# Altium footprint library Cty1.PcbLib: 1378 footprints (part 60 of 87)
Each footprint in its own frame and in the unit in brackets; x right, y up, seen from the top. Pads: shape width x height; smd on the part's side, far side on the other; paste and mask are expansions set on the pad; w line width, h text height; cw(c..) or ccw(c..) is an arc to the next point about the centre after c.
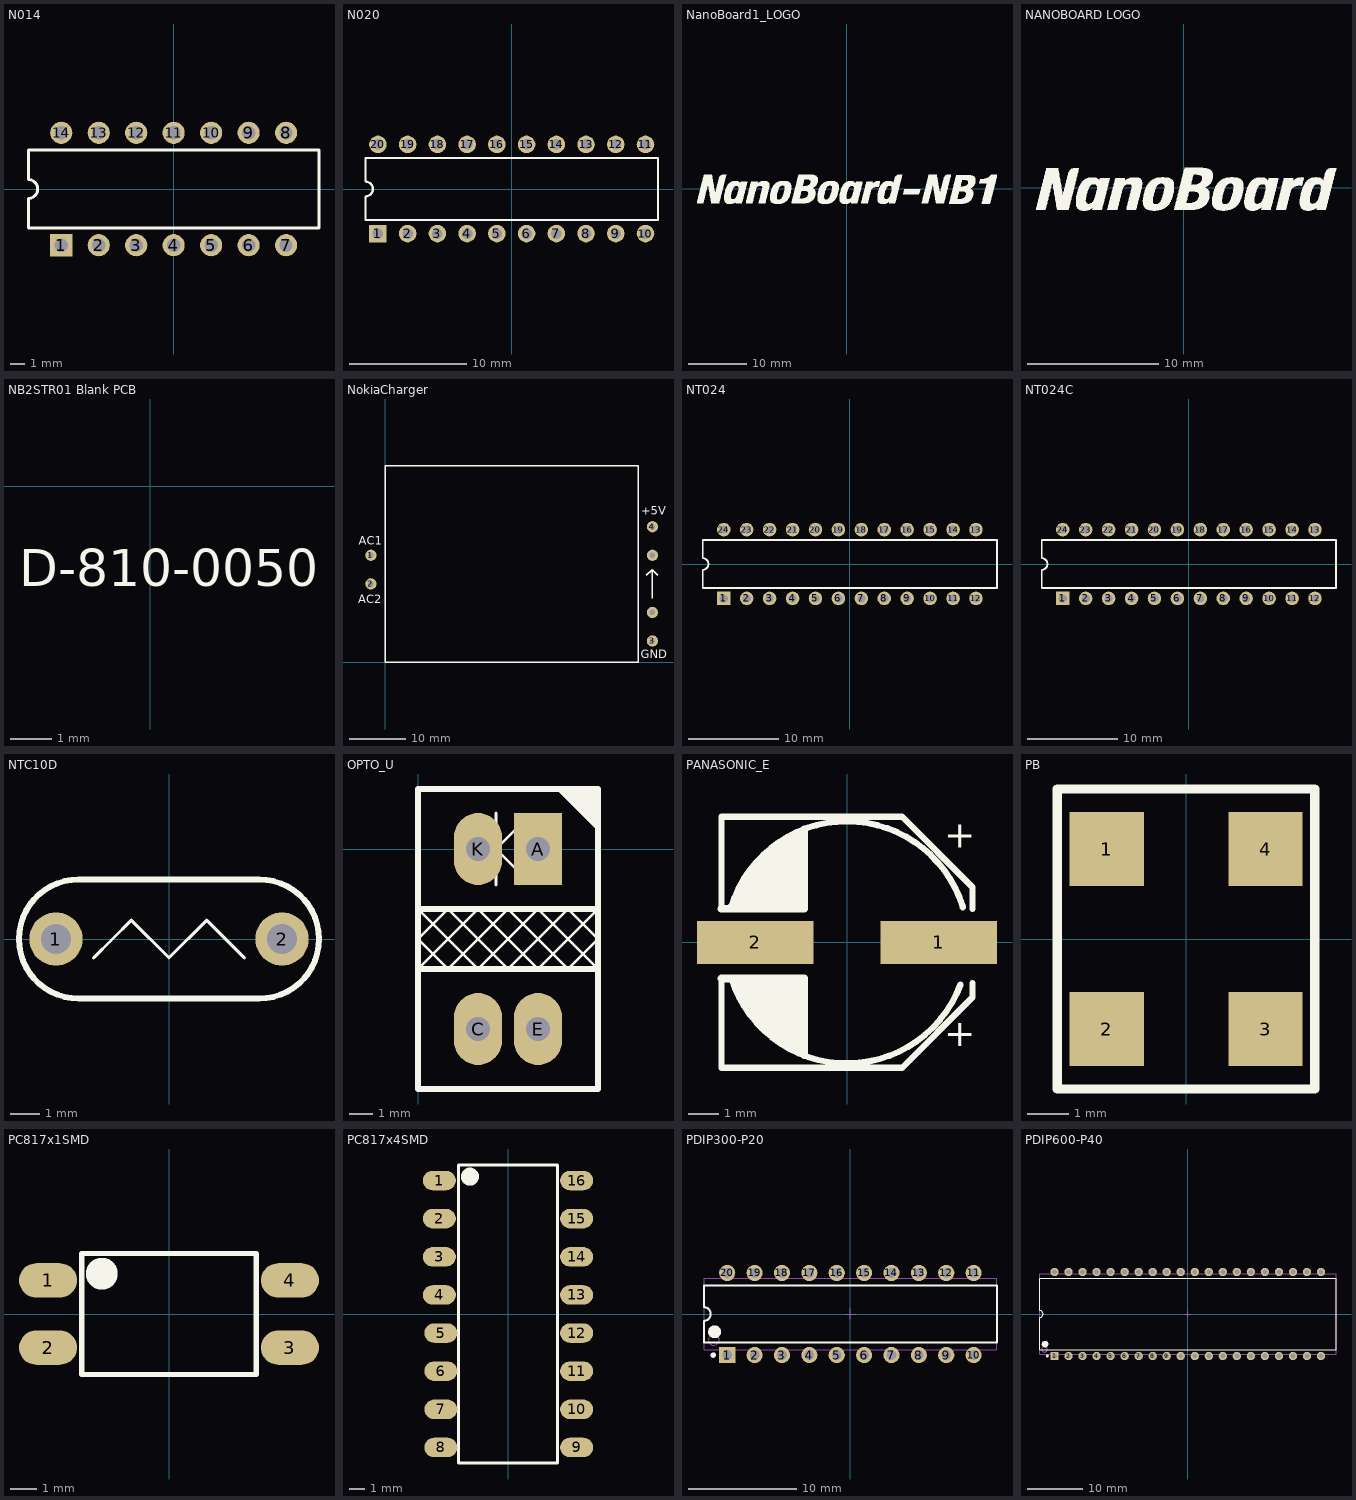
[diagram p59: the footprints below, top view; thin cyan lines are the x and y axes]

## N014 [mm] "DIP; 14 Leads; Row Spacing 7.62 mm; Pitch 2.54 mm"
height 5.08
pads (14):
  rect 1.5x1.5 hole 0.9: 1(-7.62,-3.81)
  round 1.5 hole 0.9: 2(-5.08,-3.81) 3(-2.54,-3.81) 4(0,-3.81) 5(2.54,-3.81) 6(5.08,-3.81) 7(7.62,-3.81) 8(7.62,3.81) 9(5.08,3.81) 10(2.54,3.81) 11(0,3.81) 12(-2.54,3.81) 13(-5.08,3.81) 14(-7.62,3.81)
Top Overlay:
  lines w0.2: -9.85,-2.65 9.85,-2.65 9.85,2.65 -9.85,2.65 -9.85,0.635 cw(c-9.85,0) -9.85,-0.635 -9.85,-2.65

## N020 [mm] "DIP; 20 Leads; Row Spacing 7.62 mm; Pitch 2.54 mm"
height 5.08
pads (20):
  rect 1.5x1.5 hole 0.9: 1(-11.43,-3.81)
  round 1.5 hole 0.9: 2(-8.89,-3.81) 3(-6.35,-3.81) 4(-3.81,-3.81) 5(-1.27,-3.81) 6(1.27,-3.81) 7(3.81,-3.81) 8(6.35,-3.81) 9(8.89,-3.81) 10(11.43,-3.81) 11(11.43,3.81) 12(8.89,3.81) 13(6.35,3.81) 14(3.81,3.81) 15(1.27,3.81) 16(-1.27,3.81) 17(-3.81,3.81) 18(-6.35,3.81) 19(-8.89,3.81) 20(-11.43,3.81)
Top Overlay:
  lines w0.2: -12.5,-2.65 12.5,-2.65 12.5,2.65 -12.5,2.65 -12.5,0.635 cw(c-12.5,0) -12.5,-0.635 -12.5,-2.65

## NanoBoard1_LOGO [mm] "NanoBoard 1 Logo"
height 12.3
Top Overlay:
  drawing of 3535 lines, arcs and shapes, not listed

## NANOBOARD LOGO [mm]
Top Overlay:
  drawing of 1643 lines, arcs and shapes, not listed

## NB2STR01 Blank PCB [mm]
Top Overlay:
  text "D-810-0050" at -3.175,-2.413 h0.89

## NokiaCharger [mm]
pads (6):
  round 2 hole 1: 1(-2.54,19.05) 2(-2.54,13.97) 3(47.54,3.81) 4(47.54,24.13) TEMP(47.54,8.89) TEMP(47.54,19.05)
Top Overlay:
  lines w0.254: 46.482,15.494 47.498,16.51 ; 47.498,11.43 47.498,16.51 ; 48.514,15.494 47.498,16.51 ; 0,0 45,0 ; 0,0 45,0 ; 0,0 0,35 ; 0,35 45,35 ; 0,35 45,35 ; 45,0 45,35
  text "AC2" at -4.826,10.541 h1.52
  text "AC1" at -4.699,20.955 h1.52
  text "+5V" at 45.593,26.289 h1.52
  text "GND" at 45.466,0.762 h1.52

## NT024 [mm] "DIP; 24 Leads; Row Spacing 7.62 mm; Pitch 2.54 mm"
height 5.08
pads (24):
  rect 1.5x1.5 hole 0.9: 1(-13.97,-3.81)
  round 1.5 hole 0.9: 2(-11.43,-3.81) 3(-8.89,-3.81) 4(-6.35,-3.81) 5(-3.81,-3.81) 6(-1.27,-3.81) 7(1.27,-3.81) 8(3.81,-3.81) 9(6.35,-3.81) 10(8.89,-3.81) 11(11.43,-3.81) 12(13.97,-3.81) 13(13.97,3.81) 14(11.43,3.81) 15(8.89,3.81) 16(6.35,3.81) 17(3.81,3.81) 18(1.27,3.81) 19(-1.27,3.81) 20(-3.81,3.81) 21(-6.35,3.81) 22(-8.89,3.81) 23(-11.43,3.81) 24(-13.97,3.81)
Top Overlay:
  lines w0.2: -16.3,-2.65 16.3,-2.65 16.3,2.65 -16.3,2.65 -16.3,0.635 cw(c-16.3,0) -16.3,-0.635 -16.3,-2.65

## NT024C [mm] "DIP; 24 Leads; Row Spacing 7.62 mm; Pitch 2.54 mm"
height 5.08
pads (24):
  rect 1.5x1.5 hole 0.9: 1(-13.97,-3.81)
  round 1.5 hole 0.9: 2(-11.43,-3.81) 3(-8.89,-3.81) 4(-6.35,-3.81) 5(-3.81,-3.81) 6(-1.27,-3.81) 7(1.27,-3.81) 8(3.81,-3.81) 9(6.35,-3.81) 10(8.89,-3.81) 11(11.43,-3.81) 12(13.97,-3.81) 13(13.97,3.81) 14(11.43,3.81) 15(8.89,3.81) 16(6.35,3.81) 17(3.81,3.81) 18(1.27,3.81) 19(-1.27,3.81) 20(-3.81,3.81) 21(-6.35,3.81) 22(-8.89,3.81) 23(-11.43,3.81) 24(-13.97,3.81)
Top Overlay:
  lines w0.2: -16.3,-2.65 -16.3,-0.635 ccw(c-16.3,0) -16.3,0.635 -16.3,2.65 16.3,2.65 16.3,-2.65 -16.3,-2.65

## NTC10D [mm] "Capacitor, Ceramic, ThrNTC 2A"
height 5
pads (2):
  round 1.8 hole 1: 1(-3.81,0) 2(3.81,0)
Top Overlay:
  lines w0.1: -2.54,-0.635 -1.905,0 -1.27,0.635 0,-0.635 1.27,0.635 ; 1.27,0.635 2.54,-0.635 1.27,0.635
  lines w0.2: -3.048,-2.008 cw(c-3.048,0) -3.048,2.008 3.048,2.008 cw(c3.048,0) 3.048,-2.008 -3.048,-2.008

## OPTO_U [mil] "Opto hinh chu U"
height 104.33
pads (4):
  rect 80x120 hole 40: A(200,0)
  oval 80x120 hole 40: C(100,-300) E(200,-300) K(100,0)
Top Overlay:
  region: 297.5,97.5 232.5,97.5 297.5,32.5
  lines w5: 0,-200 50,-150 100,-100 200,-200 230,-170 300,-100 300,-200 200,-100 100,-200 90,-190 60,-160 0,-100 ; 130,-60 130,60 ; 180,-50 130,0 180,50 ; 180,-50 180,50 ; 180,-50 180,50 ; 0,-150 50,-100 150,-200 250,-100 300,-150 250,-200 150,-100 50,-200 30,-180 0,-150
  lines w10: 0,-200 300,-200 ; 0,-150 0,-110 ; 0,-100 300,-100 ; 300,-150 300,-140 ; 0,-400 0,100 300,100 300,-400 0,-400
3D body "SW3dPS-optek opb620.STEP": height 374.02, standoff -100, extent 43.46,-346.85 260,46.85

## PANASONIC_E [mm] "PANASONIC_E"
pads (2):
  rect 3.8x1.4 smd: 1(3,0) 2(-3,0)
Top Overlay:
  lines w0.102: -4.1,-4.1 1.8,-4.1 4.1,-1.8 ; -4.1,4.1 1.8,4.1 4.1,1.8
  lines w0.203: -4.1,-1.177 -4.1,-4.1 1.8,-4.1 4.1,-1.8 4.1,-1.334 ; -4.1,1.097 -4.1,4.1 1.8,4.1 4.1,1.8 4.1,1.097 ; -3.782,1.152 cw(c0,0) 3.784,1.147 ; -3.774,-1.177 ccw(c0,0) 3.706,-1.379
  lines w0.254: -4.1,-1.177 -2.2,-1.177 ; -4.1,1.097 -2.169,1.097 ; -3.613,1.27 -3.429,1.097 ; -3.613,1.397 -3.782,1.152 -3.175,2.032 ; -2.169,3.251 -2.169,1.097 ; -1.397,-3.683 -1.397,-1.177 ; -1.397,1.097 -2.413,1.097 ; -1.397,3.683 -1.397,1.152 -1.651,1.097 ; -3.429,1.097 -3.429,1.905 -3.175,2.032 ; -3.429,1.097 -3.175,1.097 -3.175,2.032 ; -3.302,-1.905 -3.774,-1.177 -3.429,-1.177 -3.302,-1.905 ; -3.302,-1.905 -2.921,-2.54 ; -3.175,2.032 -3.048,2.286 -2.667,2.808 ; -2.921,-2.54 -3.175,-2.159 -3.175,-1.177 -2.921,-1.177 -2.921,-2.54 ; -2.921,-2.54 -2.413,-2.921 ; -2.667,2.808 -2.921,2.54 -2.921,1.097 -2.667,1.097 -2.667,2.808 ; -2.667,2.808 -2.413,3.048 -2.413,1.097 ; -2.413,-2.921 -2.667,-2.794 -2.667,-1.177 -2.413,-1.177 ; -2.413,-2.921 -2.413,-1.177 ; -2.413,-2.921 -2.2,-3.25 ; -2.413,-1.177 -1.397,-1.177 ; -2.413,1.097 -2.169,1.097 ; -2.2,-3.25 -1.905,-3.175 -2.032,-2.921 -2.2,-1.177 ; -2.2,-3.25 -2.032,-1.651 -1.905,-1.334 ; -2.2,-3.25 -2.2,-1.177 ; -2.2,-3.25 -2.2,-1.177 ; -2.2,-1.177 -1.905,-1.334 ; -2.2,-1.177 -1.651,-1.177 ; -2.169,1.097 -1.905,3.429 ; -2.169,1.097 -1.651,1.097 ; -1.905,-1.334 -1.651,-1.177 ; -1.905,-1.334 -1.905,-3.429 -1.651,-3.556 -1.651,-1.177 ; -1.905,3.429 -1.905,1.27 -1.651,1.097 ; -1.905,3.429 -1.651,3.556 -1.651,1.097 ; -1.651,-1.177 -1.397,-1.177
  text "+" at 3.175,2.794 h1.52
  text "+" at 3.175,-3.683 h1.52
3D body "ALU-E.STEP": height 6.2, standoff 0, extent -4.445,-4.191 4.555,4.109

## PB [mil]
pads (4):
  rect 70x70 smd: 1(-75,85) 2(-75,-85) 3(75,-85) 4(75,85)
Top Overlay:
  lines w8.66: -121.75,-141.5 -121.75,141.75 121.5,141.75 121.5,-141.5 -121.75,-141.5

## PC817x1SMD [mm] "SMD"
height 5
pads (4):
  oval 2.2x1.3 smd: 1(-4.572,1.27) 2(-4.572,-1.27) 3(4.572,-1.27) 4(4.572,1.27)
Top Overlay:
  circle w1: c-2.54,1.524 r0.1
  lines w0.2: -3.3,-2.29 -3.3,2.29 3.3,2.29 3.3,-2.29 -3.3,-2.29

## PC817x4SMD [mm] "SMD"
height 5
pads (16):
  oval 2.2x1.3 smd: 1(-4.572,8.89) 2(-4.572,6.35) 3(-4.572,3.81) 4(-4.572,1.27) 5(-4.472,-1.27) 6(-4.472,-3.81) 7(-4.472,-6.35) 8(-4.472,-8.89) 9(4.572,-8.89) 10(4.572,-6.35) 11(4.572,-3.81) 12(4.572,-1.27) 13(4.572,1.27) 14(4.572,3.81) 15(4.572,6.35) 16(4.572,8.89)
Top Overlay:
  circle w1: c-2.54,9.144 r0.1
  lines w0.2: -3.3,-9.91 -3.3,9.91 3.3,9.91 3.3,-9.91 -3.3,-9.91

## PDIP300-P20 [mm] "DIP, 20-Leads, Row Spacing 7.62mm, Pitch 2.54mm, Body 25.9x6.6mm"
height 5.34
pads (20):
  rect 1.5x1.5 hole 0.9: 1(-11.43,-3.81)
  round 1.5 hole 0.9: 2(-8.89,-3.81) 3(-6.35,-3.81) 4(-3.81,-3.81) 5(-1.27,-3.81) 6(1.27,-3.81) 7(3.81,-3.81) 8(6.35,-3.81) 9(8.89,-3.81) 10(11.43,-3.81) 11(11.43,3.81) 12(8.89,3.81) 13(6.35,3.81) 14(3.81,3.81) 15(1.27,3.81) 16(-1.27,3.81) 17(-3.81,3.81) 18(-6.35,3.81) 19(-8.89,3.81) 20(-11.43,3.81)
Top Overlay:
  circle w0.25: c-12.73,-3.81 r0.125
  circle w0.6: c-12.6,-1.65 r0.3
  lines w0.2: -13.6,-2.65 13.6,-2.65 13.6,2.65 -13.6,2.65 -13.6,0.635 cw(c-13.6,0) -13.6,-0.635 -13.6,-2.65
Mechanical 13:
  circle w0.1: c-12.675,-2.4 r0.5
  lines w0.1: -13.575,-3.3 13.575,-3.3 13.575,3.3 -13.575,3.3 -13.575,-3.3
Mechanical 15:
  lines w0.1: -0.5,0 0.5,0 ; 0,-0.5 0,0.5
3D body "PIC16F690.STEP": height 4.58, standoff -2.6, extent -13.27,-3.883 13.27,3.937

## PDIP600-P40 [mm] "DIP, 40-Leads, Row Spacing 15.24mm, Pitch 2.54mm, Body 51.8x13.5mm"
height 6.35
pads (40):
  rect 1.5x1.5 hole 0.9: 1(-24.098,-7.62)
  round 1.5 hole 0.9: 2(-21.558,-7.62) 3(-19.018,-7.62) 4(-16.478,-7.62) 5(-13.938,-7.62) 6(-11.398,-7.62) 7(-8.858,-7.62) 8(-6.318,-7.62) 9(-3.778,-7.62) 10(-1.238,-7.62) 11(1.302,-7.62) 12(3.842,-7.62) 13(6.382,-7.62) 14(8.922,-7.62) 15(11.462,-7.62) 16(14.002,-7.62) 17(16.542,-7.62) 18(19.082,-7.62) 19(21.622,-7.62) 20(24.162,-7.62) 21(24.162,7.62) 22(21.622,7.62) 23(19.082,7.62) 24(16.542,7.62) 25(14.002,7.62) 26(11.462,7.62) 27(8.922,7.62) 28(6.382,7.62) 29(3.842,7.62) 30(1.302,7.62) 31(-1.238,7.62) 32(-3.778,7.62) 33(-6.318,7.62) 34(-8.858,7.62) 35(-11.398,7.62) 36(-13.938,7.62) 37(-16.478,7.62) 38(-19.018,7.62) 39(-21.558,7.62) 40(-24.098,7.62)
Top Overlay:
  circle w0.6: c-25.818,-5.45 r0.3
  circle w0.25: c-25.398,-7.62 r0.125
  lines w0.2: -26.818,-6.45 -26.818,-0.635 ccw(c-26.818,0) -26.818,0.635 -26.818,6.45 26.882,6.45 26.882,-6.45 -26.818,-6.45
Mechanical 13:
  circle w0.1: c-25.918,-6.4 r0.5
  lines w0.1: -26.818,-7.3 -26.818,7.3 26.882,7.3 26.882,-7.3 -26.818,-7.3
Mechanical 15:
  lines w0.1: -0.468,0 0.532,0 ; 0.032,-0.5 0.032,0.5
3D body "DIP-40-microchip.step": height 3.87, standoff -3.48, extent -26.13,-7.765 26.13,7.765